# Altium footprint library ADNB95C.PcbLib: 249 footprints (part 14 of 16)
Each footprint in its own frame and in the unit in brackets; x right, y up, seen from the top. Pads: shape width x height; smd on the part's side, far side on the other; paste and mask are expansions set on the pad; w line width, h text height; cw(c..) or ccw(c..) is an arc to the next point about the centre after c.
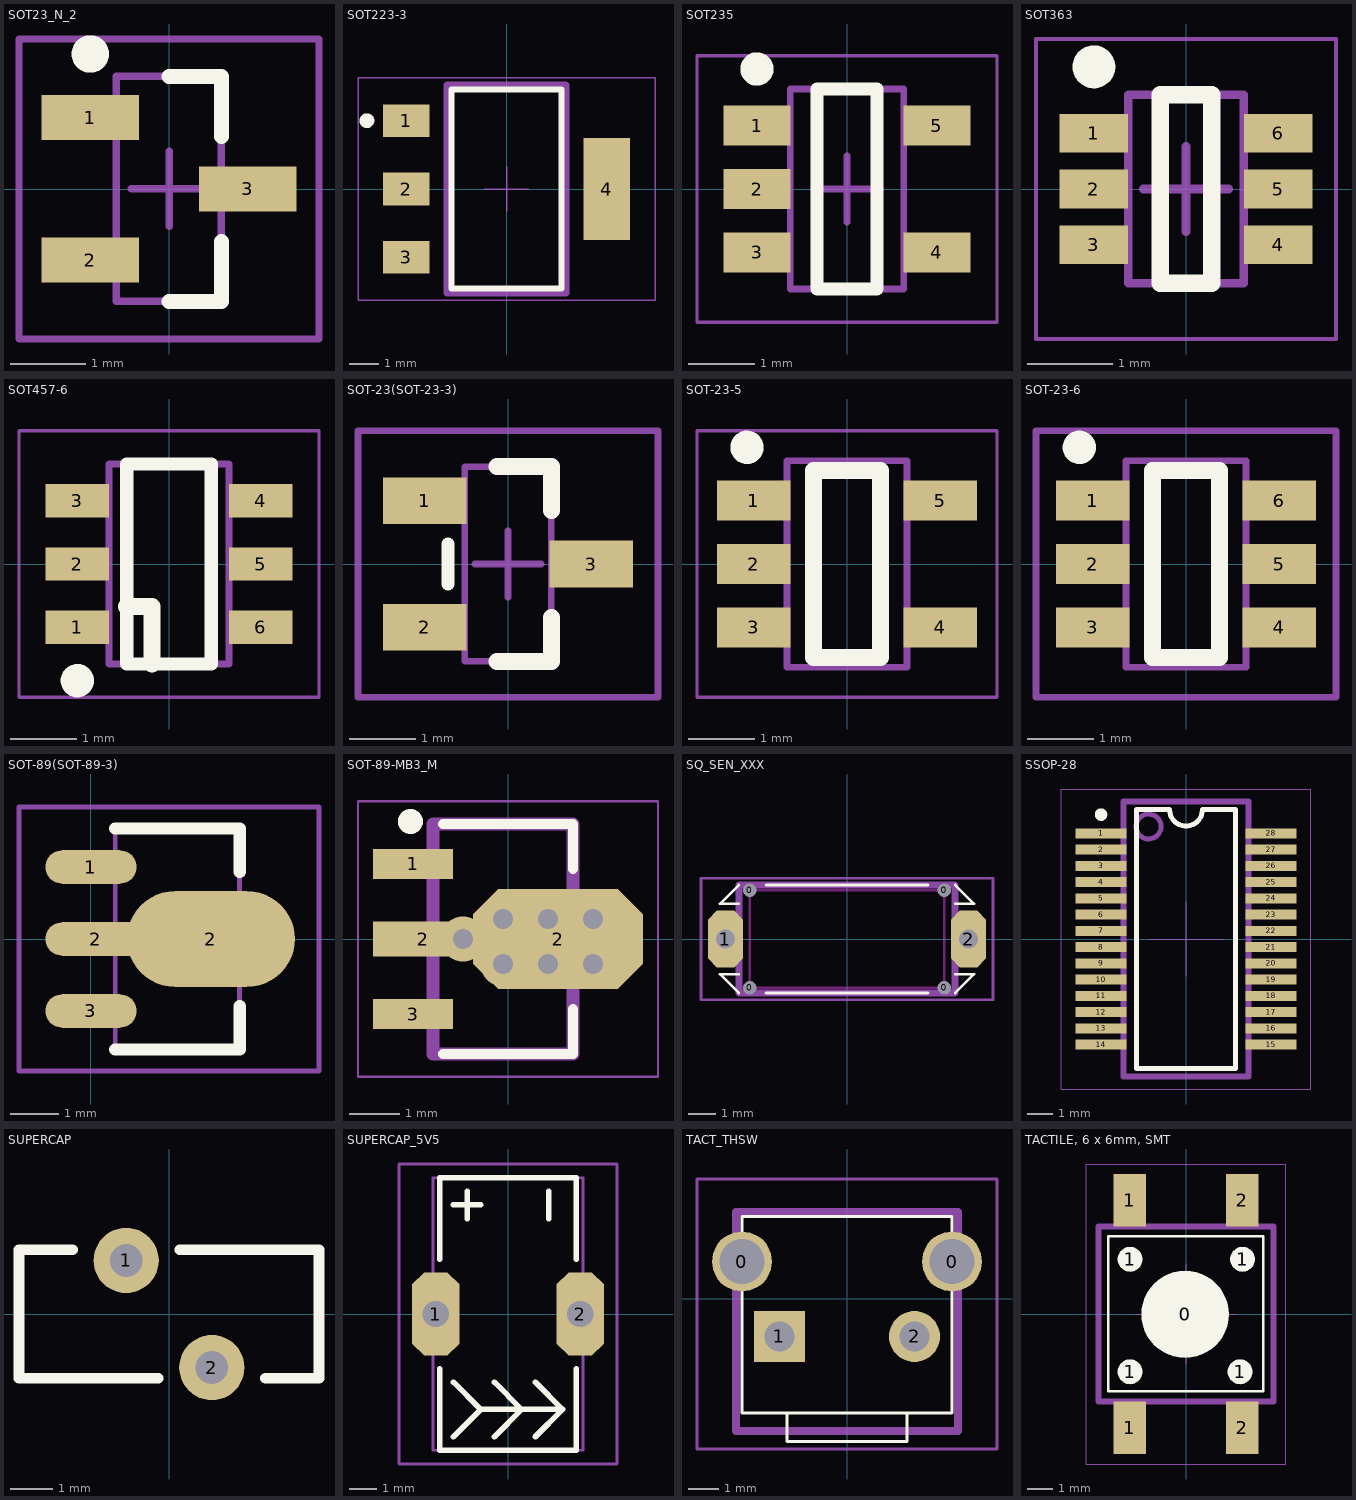
[diagram p13: the footprints below, top view; thin cyan lines are the x and y axes]

## SOT23_N_2 [mm]
pads (3):
  rect 1.3x0.6 smd: 1(-1.05,0.95) 2(-1.05,-0.95) 3(1.05,0)
Top Overlay:
  circle w0.25: c-1.05,1.8 r0.125
  lines w0.2: 0,-1.5 0.7,-1.5 0.7,-0.7 ; 0,1.5 0.7,1.5 0.7,0.7
Top Designator (Mech7):
  text ".Designator" at -3.809,-0.254 h0.76
Top Assembly:
  lines w0.1: -0.7,-1.5 -0.7,1.5 0.7,1.5 0.7,-1.5 -0.7,-1.5
Top Courtyard:
  lines w0.1: -0.5,0 0.5,0 ; 0,-0.5 0,0.5 ; -2,-2 -2,2 2,2 2,-2 -2,-2
3D body "alsrobot-SOT23.STEP": height 1.08, standoff 0, extent -1.32,-1.5 1.32,1.5

## SOT223-3 [mm] "SOT-223/SC-73; 4 Leads; Body 6.7 x 7.3 mm, inc. leads (LxW max)"
height 1.8
pads (4):
  rect 1.55x1.1 smd: 1(-3.375,2.3) 2(-3.375,0) 3(-3.375,-2.3)
  rect 1.55x3.45 smd: 4(3.375,0)
Top Overlay:
  circle w0.25: c-4.7,2.3 r0.125
  lines w0.2: -1.85,-3.35 1.85,-3.35 1.85,3.35 -1.85,3.35 -1.85,-3.35
Top Designator (Mech7):
  text ".Designator" at -0.508,7.618 h1.52
Top Assembly:
  lines w0.254: -2,-3.5 2,-3.5 2,3.5 -2,3.5 -2,-3.5
Top Courtyard:
  lines w0.05: -0.75,0 0.75,0 ; 0,-0.75 0,0.75 ; -5,-3.75 5,-3.75 5,3.75 -5,3.75 -5,-3.75
3D body "User Library-SOT223-3.STEP": height 1.7, standoff 0, extent -3.5,-3.25 3.5,3.25

## SOT235 [mm] "SOT23, 5-Leads, Body 2.90x2.80mm, Pitch 0.95mm, IPC Medium Density"
height 1.45
pads (5):
  rect 1x0.6 smd: 1(-1.35,0.95) 2(-1.35,0) 3(-1.35,-0.95) 4(1.35,-0.95) 5(1.35,0.95)
Top Overlay:
  circle w0.25: c-1.35,1.8 r0.125
  lines w0.2: -0.45,-1.5 0.45,-1.5 0.45,1.5 -0.45,1.5 -0.45,-1.5
Top Designator (Mech7):
  text ".Designator" at -3.809,-0.254 h0.76
Top Assembly:
  lines w0.1: -0.85,-1.5 -0.85,1.5 0.85,1.5 0.85,-1.5 -0.85,-1.5
Top Courtyard:
  lines w0.05: -2.25,-2 -2.25,2 2.25,2 2.25,-2 -2.25,-2
  lines w0.1: -0.5,0 0.5,0 ; 0,-0.5 0,0.5
3D body "User Library-SOT23-5-2.STEP": height 1.45, standoff 0, extent -1.4,-1.45 1.4,1.45

## SOT363 [mm] "SOT363, 6-Leads, Body 2.00x2.10mm, Pitch 0.65mm, IPC Medium Density"
height 1.1
pads (6):
  rect 0.8x0.45 smd: 1(-1.075,0.65) 2(-1.075,0) 3(-1.075,-0.65) 4(1.075,-0.65) 5(1.075,0) 6(1.075,0.65)
Top Overlay:
  circle w0.25: c-1.075,1.425 r0.125
  lines w0.2: -0.3,-1.1 -0.3,1.1 0.3,1.1 0.3,-1.1 -0.3,-1.1
Top Designator (Mech7):
  text ".Designator" at -3.809,-0.254 h0.76
Top Assembly:
  lines w0.1: -0.675,-1.1 0.675,-1.1 0.675,1.1 -0.675,1.1 -0.675,-1.1
Top Courtyard:
  lines w0.05: -1.75,-1.75 -1.75,1.75 1.75,1.75 1.75,-1.75 -1.75,-1.75
  lines w0.1: -0.5,0 0.5,0 ; 0,-0.5 0,0.5
3D body "SOT363.step": height 1.1, standoff 0, extent -1.15,-1.1 1.15,1.1

## SOT457-6 [mm] "SOT457, 6-Leads, Body 2.90x2.80mm, Pitch 0.95mm, IPC Medium Density"
height 1.3
pads (6):
  rect 0.95x0.5 smd: 1(-1.375,-0.95) 2(-1.375,0) 3(-1.375,0.95) 4(1.375,0.95) 5(1.375,0) 6(1.375,-0.95)
Top Overlay:
  circle w0.25: c-1.375,-1.75 r0.125
  lines w0.2: -0.635,-1.5 -0.635,1.5 0.635,1.5 0.635,-1.5 -0.635,-1.5
  lines w0.254: -0.635,-0.635 -0.254,-0.635 -0.254,-1.5
Top Designator (Mech7):
  text ".Designator" at -6.094,-0.406 h1.22
Top Assembly:
  lines w0.1: -0.9,-1.5 0.9,-1.5 0.9,1.5 -0.9,1.5 -0.9,-1.5
Top Courtyard:
  lines w0.05: -2.25,-2 2.25,-2 2.25,2 -2.25,2 -2.25,-2
3D body "SOT457_6.STEP": height 1.01, standoff 0.01, extent -1.4,-1.5 1.4,1.5

## SOT-23(SOT-23-3) [mm]
pads (3):
  rect 1.25x0.7 smd: 1(-1.25,0.95) 2(-1.25,-0.95) 3(1.25,0)
Top Overlay:
  lines w0.2: -0.9,-0.3 -0.9,0.3
  lines w0.254: -0.165,-1.46 0.65,-1.46 0.65,-0.8 ; -0.165,1.46 0.65,1.46 0.65,0.8
Top Designator (Mech7):
  text ".Designator" at -6.094,-0.406 h1.22
Top Assembly:
  lines w0.1: -0.65,-1.46 0.65,-1.46 0.65,1.46 -0.65,1.46 -0.65,-1.46
Top Courtyard:
  lines w0.1: -0.5,0 0.5,0 ; 0,-0.5 0,0.5 ; -2.25,-2 -2.25,2 2.25,2 2.25,-2 -2.25,-2
3D body "SOT-23.step": height 1.3, standoff 0, extent -1.5,-1.5 1.5,1.5

## SOT-23-5 [mm]
pads (5):
  rect 1.1x0.6 smd: 1(-1.4,0.95) 2(-1.4,0) 3(-1.4,-0.95) 4(1.4,-0.95) 5(1.4,0.95)
Top Overlay:
  circle w0.25: c-1.5,1.75 r0.125
  lines w0.254: -0.5,-1.4 -0.5,1.4 0.5,1.4 0.5,-1.4 -0.5,-1.4
Top Designator (Mech7):
  text ".Designator" at -3.809,-0.254 h0.76
Top Assembly:
  lines w0.1: -0.9,-1.55 0.9,-1.55 0.9,1.55 -0.9,1.55 -0.9,-1.55
Top Courtyard:
  lines w0.05: -2.25,-2 -2.25,2 2.25,2 2.25,-2 -2.25,-2
3D body "User Library-SOT23-5-2.STEP": height 1.45, standoff 0, extent -1.4,-1.45 1.4,1.45

## SOT-23-6 [mm]
pads (6):
  rect 1.1x0.6 smd: 1(-1.4,0.95) 2(-1.4,0) 3(-1.4,-0.95) 4(1.4,-0.95) 5(1.4,0) 6(1.4,0.95)
Top Overlay:
  circle w0.25: c-1.6,1.75 r0.125
  lines w0.254: -0.5,-1.4 -0.5,1.4 0.5,1.4 0.5,-1.4 -0.5,-1.4
Top Designator (Mech7):
  text ".Designator" at -3.809,-0.254 h0.76
Top Assembly:
  lines w0.1: -0.9,-1.55 -0.9,1.55 0.9,1.55 0.9,-1.55 -0.9,-1.55
Top Courtyard:
  lines w0.1: -2.25,-2 -2.25,2 2.25,2 2.25,-2 -2.25,-2
3D body "User Library-SOT23-6-2.STEP": height 1.45, standoff 0, extent -1.4,-1.45 1.4,1.45

## SOT-89(SOT-89-3) [mm]
pads (4):
  oval 1.9x0.7 smd: 1(0,1.5) 3(0,-1.5)
  oval 2.1x0.7 smd: 2(0.1,0)
  oval 3.5x2 smd: 2(2.5,0)
Top Overlay:
  lines w0.254: 0.5,-2.3 3.1,-2.3 3.1,-1.4 ; 0.5,2.3 3.1,2.3 3.1,1.4
Top Designator (Mech7):
  text ".Designator" at -7.618,-0.508 h1.52
Top Assembly:
  lines w0.1: 0.505,-2.3 0.505,2.3 3.095,2.3 3.095,-2.3 0.505,-2.3
Top Courtyard:
  lines w0.1: -1.5,-2.75 4.75,-2.75 4.75,2.75 -1.5,2.75 -1.5,-2.75
3D body "SOT-89-3.STEP": height 1.51, standoff 0, extent -0.55,-2.25 3.75,2.25

## SOT-89-MB3_M [mm] "SOT89, 3-Leads, Body 4.5x2.4 mm, Pitch 1.5mm, Lead Span 4.1mm, IPC Low Density"
height 1.6
pads (4):
  rect 1.6x0.6 smd: 1(-1.9,1.5) 3(-1.9,-1.5)
  rect 2x0.7 smd: 2(-1.7,0)
  oct 3.4x2 smd: 2(1,0)
via -0.9,0 diameter 0.9 hole 0.4
via 1.7,-0.5 diameter 0.9 hole 0.4
via 1.7,0.4 diameter 0.9 hole 0.4
via 0.8,0.4 diameter 0.9 hole 0.4
via 0.8,-0.5 diameter 0.9 hole 0.4
via -0.1,-0.5 diameter 0.9 hole 0.4
via -0.1,0.4 diameter 0.9 hole 0.4
Top Overlay:
  circle w0.25: c-1.95,2.35 r0.125
  lines w0.2: -1.3,-2.3 1.3,-2.3 1.3,-1.4 ; -1.3,2.3 1.3,2.3 1.3,1.4
Top Designator (Mech7):
  text ".Designator" at -7.618,-0.508 h1.52
Top Assembly:
  lines w0.1: -1.3,-2.3 1.3,-2.3 ; -1.3,2.3 1.3,2.3
  lines w0.254: -1.5,-2.3 -1.5,2.3 1.3,2.3 1.3,-2.3 -1.5,-2.3
Top Courtyard:
  lines w0.05: -0.5,0 0.5,0 ; 0,-0.5 0,0.5 ; -3,-2.75 -3,2.75 3,2.75 3,-2.75 -3,-2.75
3D body "User Library-SOT89-3.STEP": height 1.54, standoff 0, extent -2.05,-2.25 2.2,2.25

## SQ_SEN_XXX [mm] "SQ_SEN_XXX tilt detect sensor 3.3mmx6.9mm"
pads (6):
  round 0.45 hole 0.508 unplated mask+0.102: 0(-3.6,-1.8) 0(-3.6,1.8) 0(3.6,-1.8) 0(3.6,1.8)
  oct 1.3x2.1 hole 0.711 mask+0.127: 1(-4.5,0)
  oct 1.3x2.1 hole 0.711: 2(4.5,0)
Top Overlay:
  lines w0.1: -4,-2 -4.7,-1.3 -4,-1.3 ; -4,1.3 -4.7,1.3 -4,2 ; -3,-2 3,-2 ; -3,2 3,2 ; 4,-2 4.7,-1.3 4,-1.3 ; 4,1.3 4.7,1.3 4,2
Keep-Out Layer:
  lines w0.1: -3.6,-1.8 3.6,-1.8 3.6,1.8 -3.6,1.8 -3.6,-1.8
Top Designator (Mech7):
  text ".Designator" at -7.618,-0.508 h1.52
Top Assembly:
  lines w0.254: -4,-2 4,-2 4,2 -4,2 -4,-2
Top Courtyard:
  lines w0.1: -5.4,-2.25 -5.4,2.25 5.4,2.25 5.4,-2.25 -5.4,-2.25
3D body "SQ_SEN_XXX.SLDPRT": height 2.25, standoff -1.05, extent -3.8,-1.65 3.8,1.65

## SSOP-28 [mm] "SSOP, Plastic; 28 Leads; Body Width 5.2 mm; Pitch 0.65 mm"
height 1.99
pads (28):
  rect 2.05x0.4 smd: 1(-3.4,4.225) 2(-3.4,3.575) 3(-3.4,2.925) 4(-3.4,2.275) 5(-3.4,1.625) 6(-3.4,0.975) 7(-3.4,0.325) 8(-3.4,-0.325) 9(-3.4,-0.975) 10(-3.4,-1.625) 11(-3.4,-2.275) 12(-3.4,-2.925) 13(-3.4,-3.575) 14(-3.4,-4.225) 15(3.4,-4.225) 16(3.4,-3.575) 17(3.4,-2.925) 18(3.4,-2.275) 19(3.4,-1.625) 20(3.4,-0.975) 21(3.4,-0.325) 22(3.4,0.325) 23(3.4,0.975) 24(3.4,1.625) 25(3.4,2.275) 26(3.4,2.925) 27(3.4,3.575) 28(3.4,4.225)
Top Overlay:
  circle w0.25: c-3.4,4.975 r0.125
  lines w0.2: -1.975,-5.175 -1.975,5.175 -0.658,5.175 ccw(c0,5.175) 0.658,5.175 1.975,5.175 1.975,-5.175 -1.975,-5.175
Top Designator (Mech7):
  text ".Designator" at -7.618,-0.508 h1.52
Top Assembly:
  circle w0.2: c-1.5,4.5 r0.5
  lines w0.254: -2.5,-5.5 -2.5,5.5 2.5,5.5 2.5,-5.5 -2.5,-5.5
Top Courtyard:
  lines w0.05: -1.5,0 1.5,0 ; 0,-1.5 0,1.5 ; -5,-6 -5,6 5,6 5,-6 -5,-6
3D body "User Library-SSOP-28-2.STEP": height 2, standoff 0, extent -3.906,-5.1 3.906,5.1

## SUPERCAP [mil]
pads (2):
  round 60 hole 30: 1(-39.37,49.21) 2(39.37,-49.21)
Top Overlay:
  lines w10: -88.58,59.06 -137.8,59.06 -137.8,-59.06 -9.84,-59.06 ; 9.84,59.06 137.8,59.06 137.8,-59.06 88.58,-59.06
Top Designator (Mech7):
  text ".Designator" at -299.9,-19.99 h60

## SUPERCAP_5V5 [mil] "Supercap diameter 10mm height"
pads (2):
  oct 68x120 hole 38: 1(-104.33,0) 2(104.33,0)
Top Overlay:
  lines w8: -98.43,-78.74 -98.43,-196.85 98.43,-196.85 98.43,-78.74 ; -98.43,78.74 -98.43,196.85 98.43,196.85 98.43,78.74 ; -78.74,-177.17 -39.37,-137.8 ; -78.74,-98.43 -39.37,-137.8 ; -78.74,157.48 -39.37,157.48 ; -59.06,137.8 -59.06,177.17 ; -19.69,-177.17 19.68,-137.8 -19.69,-98.43 ; 39.37,-177.17 78.74,-137.8 ; 39.37,-98.43 78.74,-137.8 ; 59.06,137.8 59.06,177.17 ; -39.37,-137.8 78.74,-137.8
Top Designator (Mech7):
  text ".Designator" at -299.9,-19.99 h60
Top Assembly:
  lines w3.94: -108.28,-196.84 -108.28,196.85 108.26,196.85 108.26,-196.84 -108.28,-196.84
Top Courtyard:
  lines w3.94: -157.48,-216.54 157.48,-216.54 157.48,216.54 -157.48,216.54 -157.48,-216.54
3D body "User Library-EECS0HD473V.STEP": height 413.88, standoff -117.61, extent -108.27,-196.84 108.26,196.85

## TACT_THSW [mm]
pads (4):
  round 2 hole 1.5: 0(-3.5,1.25) 0(3.5,1.25)
  rect 1.7x1.7 hole 1: 1(-2.25,-1.25)
  round 1.7 hole 1: 2(2.25,-1.25)
Top Overlay:
  lines w0.1: -2,-3.8 -2,-4.75 2,-4.75 2,-3.8 ; -3.5,-3.8 -3.5,2.75 3.5,2.75 3.5,-3.8 -3.5,-3.8
Top Designator (Mech7):
  text ".Designator" at -7.618,-0.508 h1.52
Top Assembly:
  lines w0.254: -3.7,-4.4 -3.7,2.9 3.7,2.9 3.7,-4.4 -3.7,-4.4
Top Courtyard:
  lines w0.1: -5,-5 -5,4 5,4 5,-5 -5,-5
3D body "User Library-SWITCH, TACTILE, RIGHT ANGLE, 12VDC, 50MA, 3_15MM ACTUATOR, WEALTH METAL TC-0240Z.STEP": height 7.01, standoff -3.99, extent -3.7,-4.4 3.7,2.9

## TACTILE, 6 x 6mm, SMT [mm]
pads (9):
  round 3.5 on Top Overlay: 0(-0.035,-0.011)
  rect 1.3x2.1 smd: 1(-2.25,-4.55) 1(-2.25,4.55) 2(2.25,-4.55) 2(2.25,4.55)
  round 1 on Top Overlay: 1(-2.235,-2.311) 1(-2.235,2.189) 1(2.165,-2.311) 1(2.265,2.189)
Top Overlay:
  lines w0.1: -3.1,-3.1 -3.1,3.1 3.1,3.1 3.1,-3.1 -3.1,-3.1
Top Designator (Mech7):
  text ".Designator" at -7.618,-0.508 h1.52
Top Assembly:
  lines w0.254: -3.5,-3.5 3.5,-3.5 3.5,3.5 -3.5,3.5 -3.5,-3.5
Top Courtyard:
  lines w0.05: -2,0 2,0 ; 0,-2 0,2 ; -4,-6 4,-6 4,6 -4,6 -4,-6
3D body "SPST6mm_SMD.SLDPRT": height 5.07, standoff 0.1, extent -3,-5 3,5